# Altium schematic symbol library LATTICEPLDS_Library.SchLib: 291 symbols (part 21 of 32) (continued)
## LFE5UM-85F-BG381 (continued)
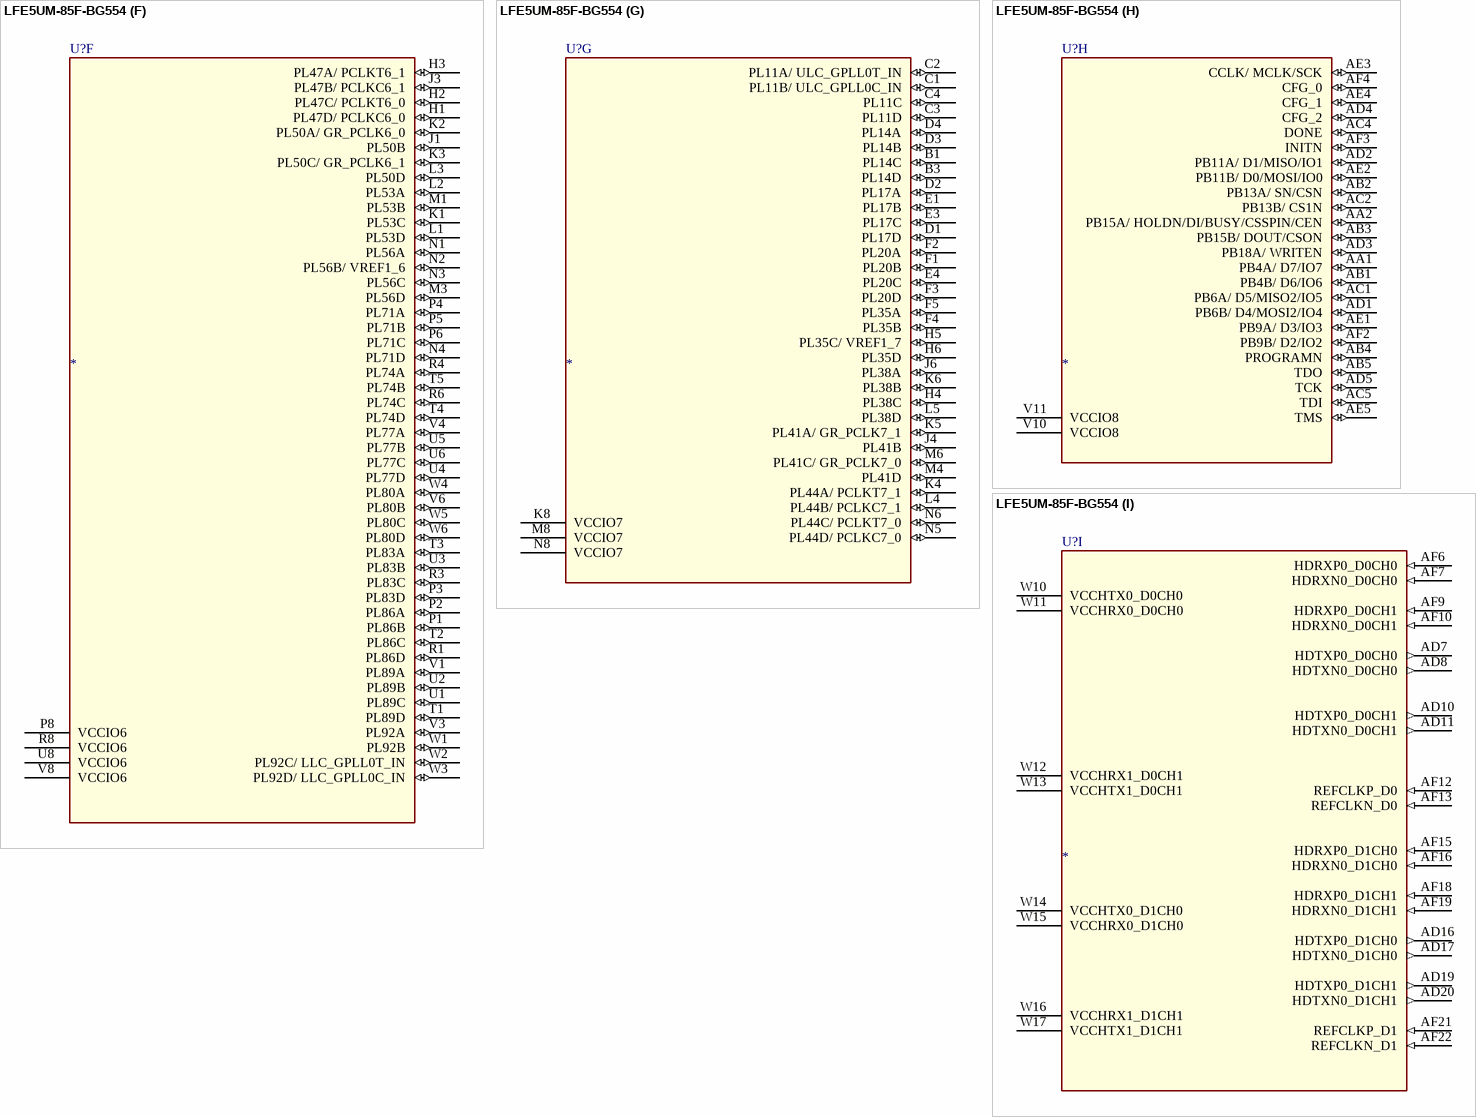
[diagram p200: symbol LFE5UM-85F-BG554]

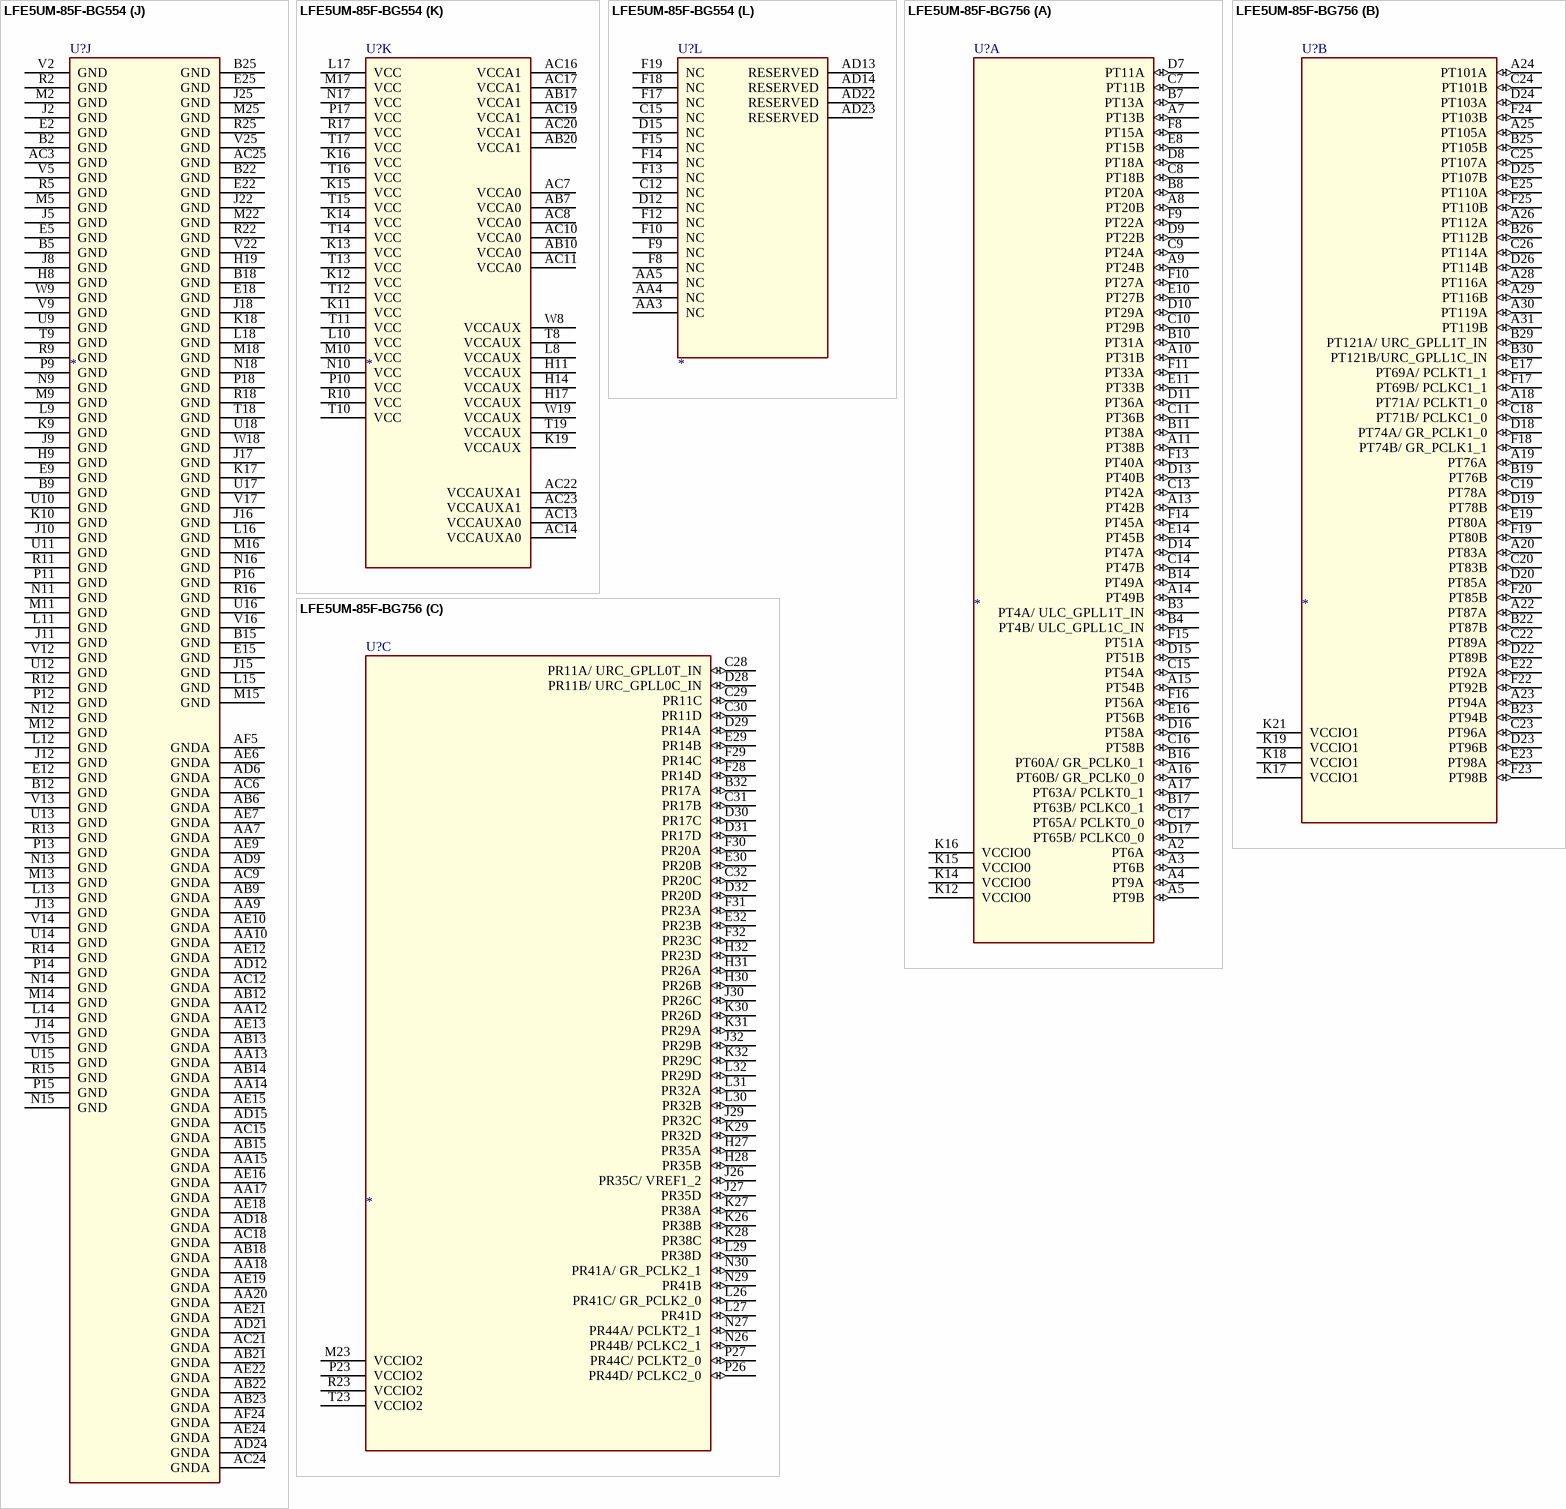
[diagram p201: symbols LFE5UM-85F-BG554 to LFE5UM-85F-BG756]

## LFE5UM-85F-BG554
designator U?
SWAP_INFO: (S1+S2+S3+S4+S5+S6+S7+S8+S9+S10+S11+S12); SPLIT_INST: TRUE
part A pins: A2 PT4A/ ULC_GPLL1T_IN (io), A3 PT4B/ ULC_GPLL1C_IN (io), A4 PT6B (io), A5 PT15A (io), A6 PT15B (io), A8 PT18A (io), A9 PT18B (io), A10 PT58A (io), A11 PT58B (io), A12 PT65A/ PCLKT0_0 (io), A13 PT65B/ PCLKC0_0 (io), B4 PT6A (io), B6 PT13B (io), B8 PT20A (io), B10 PT56B (io), B11 PT60B/ GR_PCLK0_0 (io), C5 PT9B (io), C6 PT13A (io), C8 PT20B (io), C9 PT51B (io), C10 PT56A (io), C11 PT60A/ GR_PCLK0_1 (io), D5 PT9A (io), D6 PT11B (io), D8 PT49B (io), D9 PT51A (io), D10 PT54B (io), D11 PT63B/ PCLKC0_1 (io), E6 PT11A (io), E8 PT49A (io), E10 PT54A (io), E11 PT63A/ PCLKT0_1 (io), H10 VCCIO0 (power), H12 VCCIO0 (power), H13 VCCIO0 (power)
part B pins: A14 PT78A (io), A15 PT78B (io), A16 PT85A (io), A17 PT85B (io), A18 PT107A (io), A19 PT107B (io), A21 PT110A (io), A22 PT110B (io), A23 PT119A (io), A24 PT121A/ URC_GPLL1T_IN (io), A25 PT121B/ URC_GPLL1C_IN (io), B13 PT76A (io), B14 PT76B (io), B16 PT83A (io), B17 PT96A (io), B19 PT105B (io), B21 PT112A (io), B23 PT119B (io), C13 PT74A/ GR_PCLK1_0 (io), C14 PT74B/ GR_PCLK1_1 (io), C16 PT83B (io), C17 PT96B (io), C18 PT101A (io), C19 PT105A (io), C21 PT112B (io), C22 PT116A (io), D13 PT71A/ PCLKT1_0 (io), D14 PT71B/ PCLKC1_0 (io), D16 PT80A (io), D17 PT98A (io), D18 PT101B (io), D19 PT103B (io), D21 PT114A (io), D22 PT116B (io), E13 PT69A/ PCLKT1_1 (io), E14 PT69B/ PCLKC1_1 (io), E16 PT80B (io), E17 PT98B (io), E19 PT103A (io), E21 PT114B (io), H15 VCCIO1 (power), H16 VCCIO1 (power), H18 VCCIO1 (power)
part C pins: B24 PR14D (io), B26 PR14C (io), C23 PR11C (io), C24 PR11D (io), C25 PR11A/ URC_GPLL0T_IN (io), C26 PR11B/ URC_GPLL0C_IN (io), D23 PR14A (io), D24 PR14B (io), D25 PR17A (io), D26 PR17D (io), E23 PR20C (io), E24 PR17C (io), E26 PR17B (io), F22 PR35A (io), F23 PR35B (io), F24 PR20D (io), F25 PR20A (io), F26 PR20B (io), H21 PR35D (io), H22 PR35C/ VREF1_2 (io), H23 PR38C (io), J19 VCCIO2 (power), J21 PR38A (io), J23 PR41B (io), K21 PR38B (io), K22 PR41A/ GR_PCLK2_1 (io), K23 PR44A/ PCLKT2_1 (io), L19 VCCIO2 (power), L22 PR38D (io), L23 PR44B/ PCLKC2_1 (io), M19 VCCIO2 (power), M21 PR41C/ GR_PCLK2_0 (io), M23 PR41D (io), N19 VCCIO2 (power), N21 PR44C/ PCLKT2_0 (io), N22 PR44D/ PCLKC2_0 (io)
part D pins: H24 PR47A/ PCLKT3_1 (io), H25 PR47C/ PCLKT3_0 (io), H26 PR47D/ PCLKC3_0 (io), J24 PR47B/ PCLKC3_1 (io), J26 PR50B (io), K24 PR50C/ GR_PCLK3_1 (io), K25 PR50A/ GR_PCLK3_0 (io), K26 PR53C (io), L24 PR50D (io), L25 PR53A (io), L26 PR53D (io), M24 PR56D (io), M26 PR53B (io), N23 PR71D (io), N24 PR56C (io), N25 PR56B/ VREF1_3 (io), N26 PR56A (io), P19 VCCIO3 (power), P21 PR71C (io), P22 PR71B (io), P23 PR71A (io), P24 PR83D (io), P25 PR86A (io), P26 PR86B (io), R19 VCCIO3 (power), R21 PR74C (io), R23 PR74A (io), R24 PR83C (io), R26 PR86D (io), T22 PR74B (io), T23 PR74D (io), T24 PR83A (io), T25 PR86C (io), T26 PR89D (io), U19 VCCIO3 (power), U21 PR77C (io), U22 PR77B (io), U23 PR77D (io), U24 PR83B (io), U25 PR89B (io), U26 PR89C (io), V21 PR80B (io), V23 PR77A (io), V24 PR92A (io), V26 PR89A (io), W21 PR80D (io), W22 PR80C (io), W23 PR80A (io), W24 PR92D/ LRC_GPLL0C_IN (io), W25 PR92C/ LRC_GPLL0T_IN (io), W26 PR92B (io)
part E pins: AA22 PB107A (io), AA23 PB107B (io), AA24 PB110B (io), AA25 PB112B (io), AA26 PB121B (io), AB24 PB110A (io), AB25 PB112A (io), AB26 PB121A (io), AC26 PB119B (io), AD25 PB114B (io), AD26 PB119A (io), AE25 PB114A (io), AE26 PB116B (io), AF25 PB116A (io), V18 VCCIO4 (power), V19 VCCIO4 (power)
part F pins: H1 PL47D/ PCLKC6_0 (io), H2 PL47C/ PCLKT6_0 (io), H3 PL47A/ PCLKT6_1 (io), J1 PL50B (io), J3 PL47B/ PCLKC6_1 (io), K1 PL53C (io), K2 PL50A/ GR_PCLK6_0 (io), K3 PL50C/ GR_PCLK6_1 (io), L1 PL53D (io), L2 PL53A (io), L3 PL50D (io), M1 PL53B (io), M3 PL56D (io), N1 PL56A (io), N2 PL56B/ VREF1_6 (io), N3 PL56C (io), N4 PL71D (io), P1 PL86B (io), P2 PL86A (io), P3 PL83D (io), P4 PL71A (io), P5 PL71B (io), P6 PL71C (io), P8 VCCIO6 (power), R1 PL86D (io), R3 PL83C (io), R4 PL74A (io), R6 PL74C (io), R8 VCCIO6 (power), T1 PL89D (io), T2 PL86C (io), T3 PL83A (io), T4 PL74D (io), T5 PL74B (io), U1 PL89C (io), U2 PL89B (io), U3 PL83B (io), U4 PL77D (io), U5 PL77B (io), U6 PL77C (io), U8 VCCIO6 (power), V1 PL89A (io), V3 PL92A (io), V4 PL77A (io), V6 PL80B (io), V8 VCCIO6 (power), W1 PL92B (io), W2 PL92C/ LLC_GPLL0T_IN (io), W3 PL92D/ LLC_GPLL0C_IN (io), W4 PL80A (io), W5 PL80C (io), W6 PL80D (io)
part G pins: B1 PL14C (io), B3 PL14D (io), C1 PL11B/ ULC_GPLL0C_IN (io), C2 PL11A/ ULC_GPLL0T_IN (io), C3 PL11D (io), C4 PL11C (io), D1 PL17D (io), D2 PL17A (io), D3 PL14B (io), D4 PL14A (io), E1 PL17B (io), E3 PL17C (io), E4 PL20C (io), F1 PL20B (io), F2 PL20A (io), F3 PL20D (io), F4 PL35B (io), F5 PL35A (io), H4 PL38C (io), H5 PL35C/ VREF1_7 (io), H6 PL35D (io), J4 PL41B (io), J6 PL38A (io), K4 PL44A/ PCLKT7_1 (io), K5 PL41A/ GR_PCLK7_1 (io), K6 PL38B (io), K8 VCCIO7 (power), L4 PL44B/ PCLKC7_1 (io), L5 PL38D (io), M4 PL41D (io), M6 PL41C/ GR_PCLK7_0 (io), M8 VCCIO7 (power), N5 PL44D/ PCLKC7_0 (io), N6 PL44C/ PCLKT7_0 (io), N8 VCCIO7 (power)
part H pins: AA1 PB4A/ D7/IO7 (io), AA2 PB15A/ HOLDN/DI/BUSY/CSSPIN/CEN (io), AB1 PB4B/ D6/IO6 (io), AB2 PB13A/ SN/CSN (io), AB3 PB15B/ DOUT/CSON (io), AB4 PROGRAMN (io), AB5 TDO (io), AC1 PB6A/ D5/MISO2/IO5 (io), AC2 PB13B/ CS1N (io), AC4 DONE (io), AC5 TDI (io), AD1 PB6B/ D4/MOSI2/IO4 (io), AD2 PB11A/ D1/MISO/IO1 (io), AD3 PB18A/ WRITEN (io), AD4 CFG_2 (io), AD5 TCK (io), AE1 PB9A/ D3/IO3 (io), AE2 PB11B/ D0/MOSI/IO0 (io), AE3 CCLK/ MCLK/SCK (io), AE4 CFG_1 (io), AE5 TMS (io), AF2 PB9B/ D2/IO2 (io), AF3 INITN (io), AF4 CFG_0 (io), V10 VCCIO8 (power), V11 VCCIO8 (power)
part I pins: AD7 HDTXP0_D0CH0 (out), AD8 HDTXN0_D0CH0 (out), AD10 HDTXP0_D0CH1 (out), AD11 HDTXN0_D0CH1 (out), AD16 HDTXP0_D1CH0 (out), AD17 HDTXN0_D1CH0 (out), AD19 HDTXP0_D1CH1 (out), AD20 HDTXN0_D1CH1 (out), AF6 HDRXP0_D0CH0 (in), AF7 HDRXN0_D0CH0 (in), AF9 HDRXP0_D0CH1 (in), AF10 HDRXN0_D0CH1 (in), AF12 REFCLKP_D0 (in), AF13 REFCLKN_D0 (in), AF15 HDRXP0_D1CH0 (in), AF16 HDRXN0_D1CH0 (in), AF18 HDRXP0_D1CH1 (in), AF19 HDRXN0_D1CH1 (in), AF21 REFCLKP_D1 (in), AF22 REFCLKN_D1 (in), W10 VCCHTX0_D0CH0 (power), W11 VCCHRX0_D0CH0 (power), W12 VCCHRX1_D0CH1 (power), W13 VCCHTX1_D0CH1 (power), W14 VCCHTX0_D1CH0 (power), W15 VCCHRX0_D1CH0 (power), W16 VCCHRX1_D1CH1 (power), W17 VCCHTX1_D1CH1 (power)
part J pins: AA7 GNDA (power), AA9 GNDA (power), AA10 GNDA (power), AA12 GNDA (power), AA13 GNDA (power), AA14 GNDA (power), AA15 GNDA (power), AA17 GNDA (power), AA18 GNDA (power), AA20 GNDA (power), AB6 GNDA (power), AB9 GNDA (power), AB12 GNDA (power), AB13 GNDA (power), AB14 GNDA (power), AB15 GNDA (power), AB18 GNDA (power), AB21 GNDA (power), AB22 GNDA (power), AB23 GNDA (power), AC3 GND (power), AC6 GNDA (power), AC9 GNDA (power), AC12 GNDA (power), AC15 GNDA (power), AC18 GNDA (power), AC21 GNDA (power), AC24 GNDA (power), AC25 GND (power), AD6 GNDA (power), AD9 GNDA (power), AD12 GNDA (power), AD15 GNDA (power), AD18 GNDA (power), AD21 GNDA (power), AD24 GNDA (power), AE6 GNDA (power), AE7 GNDA (power), AE9 GNDA (power), AE10 GNDA (power), AE12 GNDA (power), AE13 GNDA (power), AE15 GNDA (power), AE16 GNDA (power), AE18 GNDA (power), AE19 GNDA (power), AE21 GNDA (power), AE22 GNDA (power), AE24 GNDA (power), AF5 GNDA (power), AF24 GNDA (power), B2 GND (power), B5 GND (power), B9 GND (power), B12 GND (power), B15 GND (power), B18 GND (power), B22 GND (power), B25 GND (power), E2 GND (power), E5 GND (power), E9 GND (power), E12 GND (power), E15 GND (power), E18 GND (power), E22 GND (power), E25 GND (power), H8 GND (power), H9 GND (power), H19 GND (power), J2 GND (power), J5 GND (power), J8 GND (power), J9 GND (power), J10 GND (power), J11 GND (power), J12 GND (power), J13 GND (power), J14 GND (power), J15 GND (power), J16 GND (power), J17 GND (power), J18 GND (power), J22 GND (power), J25 GND (power), K9 GND (power), K10 GND (power), K17 GND (power), K18 GND (power), L9 GND (power), L11 GND (power), L12 GND (power), L13 GND (power), L14 GND (power), L15 GND (power), L16 GND (power), L18 GND (power), M2 GND (power), M5 GND (power), M9 GND (power), M11 GND (power), M12 GND (power), M13 GND (power), M14 GND (power), M15 GND (power), M16 GND (power), M18 GND (power), M22 GND (power), M25 GND (power), N9 GND (power), N11 GND (power), N12 GND (power), N13 GND (power), N14 GND (power), N15 GND (power), N16 GND (power), N18 GND (power), P9 GND (power), P11 GND (power), P12 GND (power), P13 GND (power), P14 GND (power), P15 GND (power), P16 GND (power), P18 GND (power), R2 GND (power), R5 GND (power), R9 GND (power), R11 GND (power), R12 GND (power), R13 GND (power), R14 GND (power), R15 GND (power), R16 GND (power), R18 GND (power), R22 GND (power), R25 GND (power), T9 GND (power), T18 GND (power), U9 GND (power), U10 GND (power), U11 GND (power), U12 GND (power), U13 GND (power), U14 GND (power), U15 GND (power), U16 GND (power), U17 GND (power), U18 GND (power), V2 GND (power), V5 GND (power), V9 GND (power), V12 GND (power), V13 GND (power), V14 GND (power), V15 GND (power), V16 GND (power), V17 GND (power), V22 GND (power), V25 GND (power), W9 GND (power), W18 GND (power)
part K pins: AB7 VCCA0 (power), AB10 VCCA0 (power), AB17 VCCA1 (power), AB20 VCCA1 (power), AC7 VCCA0 (power), AC8 VCCA0 (power), AC10 VCCA0 (power), AC11 VCCA0 (power), AC13 VCCAUXA0 (power), AC14 VCCAUXA0 (power), AC16 VCCA1 (power), AC17 VCCA1 (power), AC19 VCCA1 (power), AC20 VCCA1 (power), AC22 VCCAUXA1 (power), AC23 VCCAUXA1 (power), H11 VCCAUX (power), H14 VCCAUX (power), H17 VCCAUX (power), K11 VCC (power), K12 VCC (power), K13 VCC (power), K14 VCC (power), K15 VCC (power), K16 VCC (power), K19 VCCAUX (power), L8 VCCAUX (power), L10 VCC (power), L17 VCC (power), M10 VCC (power), M17 VCC (power), N10 VCC (power), N17 VCC (power), P10 VCC (power), P17 VCC (power), R10 VCC (power), R17 VCC (power), T8 VCCAUX (power), T10 VCC (power), T11 VCC (power), T12 VCC (power), T13 VCC (power), T14 VCC (power), T15 VCC (power), T16 VCC (power), T17 VCC (power), T19 VCCAUX (power), W8 VCCAUX (power), W19 VCCAUX (power)
part L pins: AA3 NC (power), AA4 NC (power), AA5 NC (power), AD13 RESERVED (power), AD14 RESERVED (power), AD22 RESERVED (power), AD23 RESERVED (power), C12 NC (power), C15 NC (power), D12 NC (power), D15 NC (power), F8 NC (power), F9 NC (power), F10 NC (power), F12 NC (power), F13 NC (power), F14 NC (power), F15 NC (power), F17 NC (power), F18 NC (power), F19 NC (power)

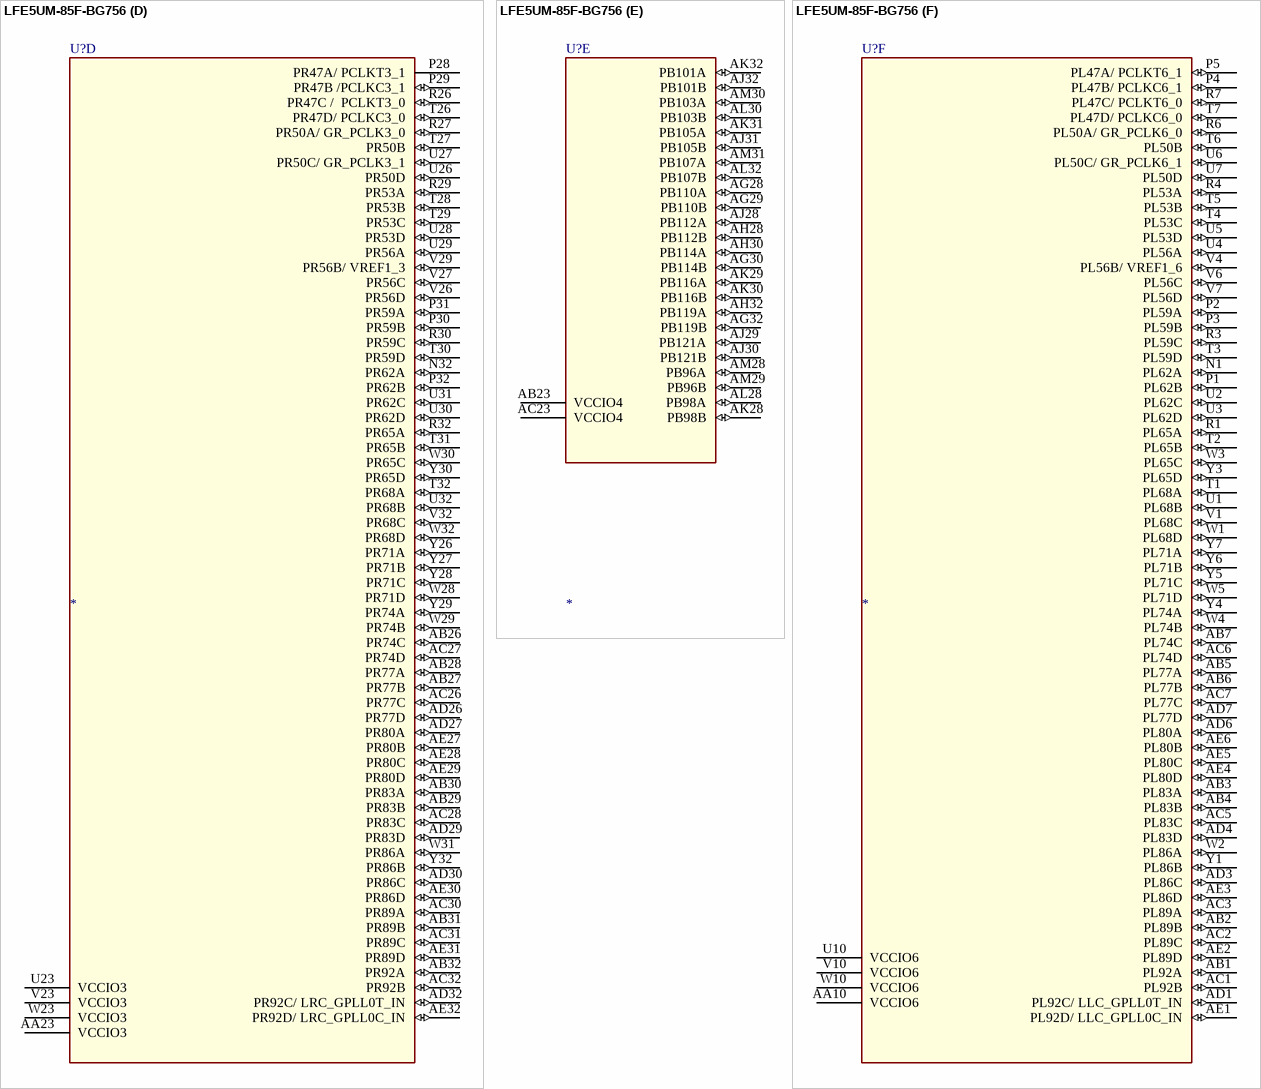
[diagram p202: symbol LFE5UM-85F-BG756]
